# Altium footprint library ST Microelectronics STM32 G4.PcbLib: 21 footprints (part 1 of 3)
Each footprint in its own frame and in the unit in brackets; x right, y up, seen from the top. Pads: shape width x height; smd on the part's side, far side on the other; paste and mask are expansions set on the pad; w line width, h text height; cw(c..) or ccw(c..) is an arc to the next point about the centre after c.
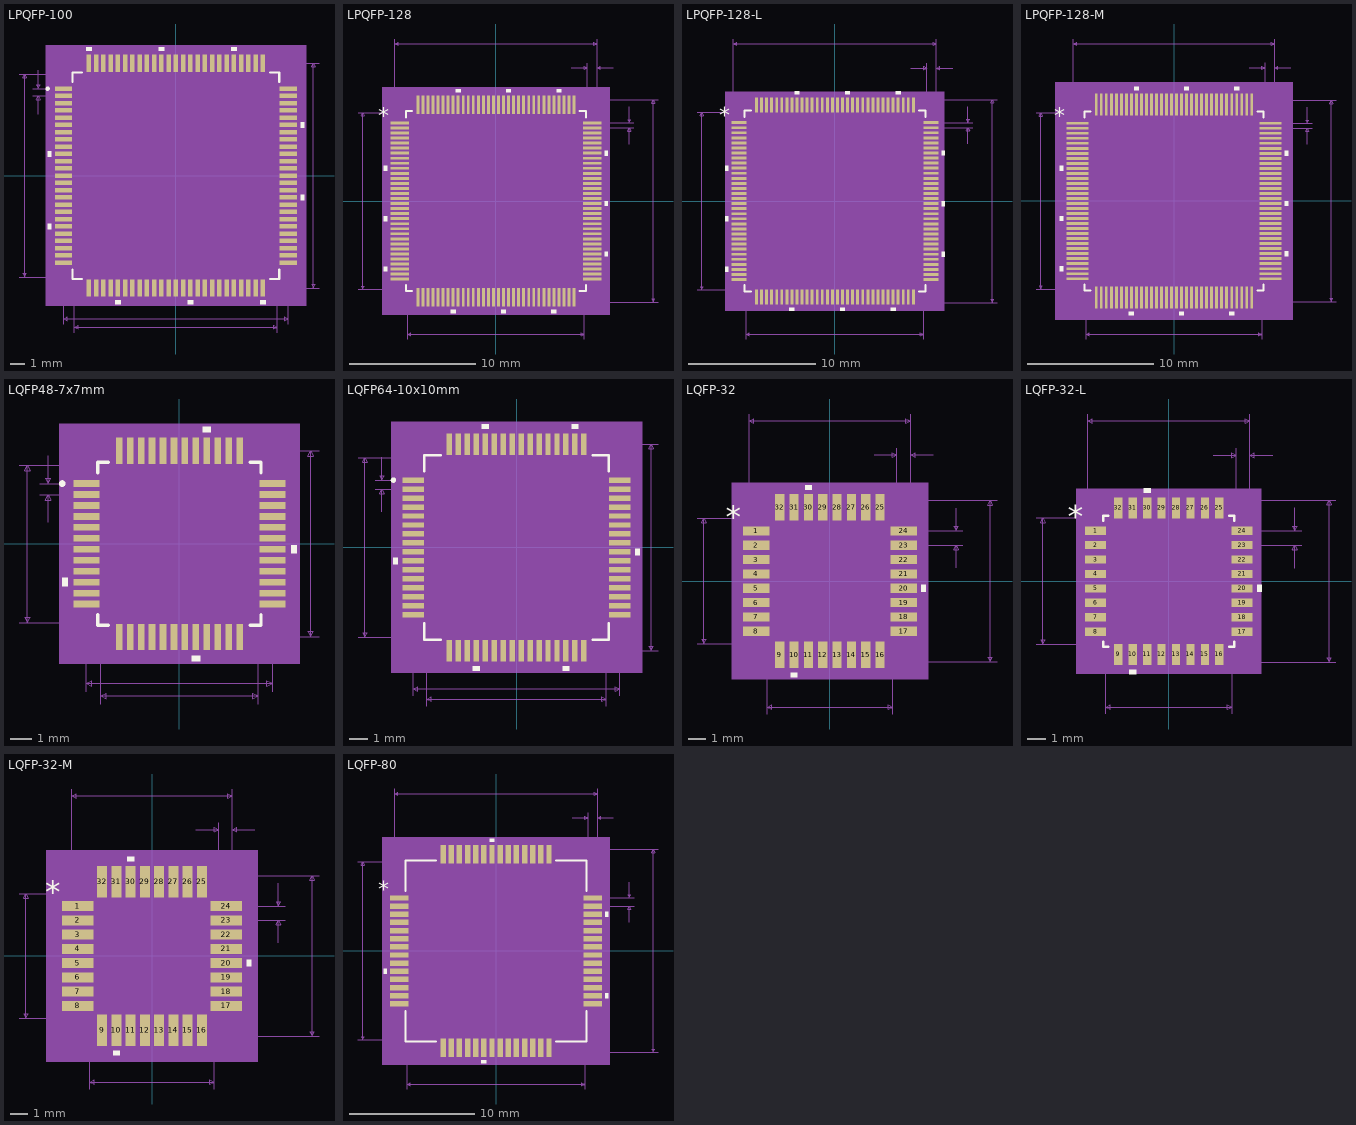
[diagram p0: the footprints below, top view; thin cyan lines are the x and y axes]

## LPQFP-100 [mil]
pads (100):
  rect 47x12 smd paste+0 mask+0: 1(-305.12,236.22) 2(-305.12,216.54) 3(-305.12,196.85) 4(-305.12,177.17) 5(-305.12,157.48) 6(-305.12,137.8) 7(-305.12,118.11) 8(-305.12,98.43) 9(-305.12,78.74) 10(-305.12,59.06) 11(-305.12,39.37) 12(-305.12,19.69) 13(-305.12,0) 14(-305.12,-19.68) 15(-305.12,-39.37) 16(-305.12,-59.06) 17(-305.12,-78.74) 18(-305.12,-98.43) 19(-305.12,-118.11) 20(-305.12,-137.8) 21(-305.12,-157.48) 22(-305.12,-177.17) 23(-305.12,-196.85) 24(-305.12,-216.54) 25(-305.12,-236.22) 51(305.12,-236.22) 52(305.12,-216.54) 53(305.12,-196.85) 54(305.12,-177.17) 55(305.12,-157.48) 56(305.12,-137.8) 57(305.12,-118.11) 58(305.12,-98.43) 59(305.12,-78.74) 60(305.12,-59.06) 61(305.12,-39.37) 62(305.12,-19.68) 63(305.12,0) 64(305.12,19.68) 65(305.12,39.37) 66(305.12,59.06) 67(305.12,78.74) 68(305.12,98.43) 69(305.12,118.11) 70(305.12,137.8) 71(305.12,157.48) 72(305.12,177.17) 73(305.12,196.85) 74(305.12,216.54) 75(305.12,236.22)
  rect 12x47 smd paste+0 mask+0: 26(-236.22,-305.12) 27(-216.54,-305.12) 28(-196.85,-305.12) 29(-177.17,-305.12) 30(-157.48,-305.12) 31(-137.8,-305.12) 32(-118.11,-305.12) 33(-98.43,-305.12) 34(-78.74,-305.12) 35(-59.06,-305.12) 36(-39.37,-305.12) 37(-19.68,-305.12) 38(0,-305.12) 39(19.68,-305.12) 40(39.37,-305.12) 41(59.06,-305.12) 42(78.74,-305.12) 43(98.43,-305.12) 44(118.11,-305.12) 45(137.8,-305.12) 46(157.48,-305.12) 47(177.17,-305.12) 48(196.85,-305.12) 49(216.54,-305.12) 50(236.22,-305.12) 76(236.22,305.12) 77(216.54,305.12) 78(196.85,305.12) 79(177.17,305.12) 80(157.48,305.12) 81(137.8,305.12) 82(118.11,305.12) 83(98.43,305.12) 84(78.74,305.12) 85(59.06,305.12) 86(39.37,305.12) 87(19.68,305.12) 88(0,305.12) 89(-19.68,305.12) 90(-39.37,305.12) 91(-59.06,305.12) 92(-78.74,305.12) 93(-98.43,305.12) 94(-118.11,305.12) 95(-137.8,305.12) 96(-157.48,305.12) 97(-177.17,305.12) 98(-196.85,305.12) 99(-216.54,305.12) 100(-236.22,305.12)
Top Overlay:
  circle w6: c-348.46,236.22 r3
  region: -228.72,338.62 -243.72,338.62 -243.72,348.62 -228.72,348.62
  region: -31.87,338.62 -46.87,338.62 -46.87,348.62 -31.87,348.62
  region: 164.98,338.62 149.98,338.62 149.98,348.62 164.98,348.62
  region: 338.62,145.3 348.62,145.3 348.62,130.3 338.62,130.3
  region: 338.62,-51.56 348.62,-51.56 348.62,-66.56 338.62,-66.56
  region: 243.72,-338.62 228.72,-338.62 228.72,-348.62 243.72,-348.62
  region: 46.87,-338.62 31.87,-338.62 31.87,-348.62 46.87,-348.62
  region: -149.98,-338.62 -164.98,-338.62 -164.98,-348.62 -149.98,-348.62
  region: -338.62,-130.3 -348.62,-130.3 -348.62,-145.3 -338.62,-145.3
  region: -338.62,66.56 -348.62,66.56 -348.62,51.56 -338.62,51.56
  lines w6: -280.5,-255.27 -280.5,-280.5 -255.27,-280.5 ; -280.5,255.27 -280.5,280.5 -255.27,280.5 ; 255.27,-280.5 280.5,-280.5 280.5,-255.27 ; 255.27,280.5 280.5,280.5 280.5,255.27
Mechanical 5:
  region: 353.62,-353.62 -353.62,-353.62 -353.62,353.62 353.62,353.62
Mechanical 7:
  lines w1: -426.12,-275.5 -236.22,-275.5 ; -426.12,275.5 -236.22,275.5 ; -388.62,216.54 -305.12,216.54 ; -388.62,236.22 -305.12,236.22 ; -373.62,166.54 -373.62,216.54 ; -373.62,286.22 -373.62,236.22 ; -305.12,-403.62 -305.12,-224.22 ; -275.5,-426.12 -275.5,-236.22 ; 248.22,-305.12 388.62,-305.12 ; 248.22,305.12 388.62,305.12 ; 275.5,-426.12 275.5,-236.22 ; 305.12,-403.62 305.12,-224.22 ; -411.12,-275.5 -406.12,-265.5 -416.12,-265.5 -411.12,-275.5 ; -411.12,-275.5 -411.12,275.5 ; -411.12,275.5 -406.12,265.5 -416.12,265.5 -411.12,275.5 ; -373.62,216.54 -368.62,206.54 -378.62,206.54 -373.62,216.54 ; -373.62,236.22 -368.62,246.22 -378.62,246.22 -373.62,236.22 ; -305.12,-388.62 -295.12,-393.62 -295.12,-383.62 -305.12,-388.62 ; -305.12,-388.62 305.12,-388.62 ; -275.5,-411.12 -265.5,-416.12 -265.5,-406.12 -275.5,-411.12 ; -275.5,-411.12 275.5,-411.12 ; 275.5,-411.12 265.5,-416.12 265.5,-406.12 275.5,-411.12 ; 305.12,-388.62 295.12,-393.62 295.12,-383.62 305.12,-388.62 ; 373.62,-305.12 378.62,-295.12 368.62,-295.12 373.62,-305.12 ; 373.62,-305.12 373.62,305.12 ; 373.62,305.12 378.62,295.12 368.62,295.12 373.62,305.12
  text "0.551in/13.995mm" at -631.12,-12.5 h25
  text "0.551in/13.995mm" at -100,-456.12 h25
  text "0.61in/15.5mm" at -81.25,-433.62 h25
  text "0.61in/15.5mm" at 393.62,-12.5 h25
  text "0.02in/0.5mm" at -543.62,213.88 h25
  text "Alt 2 Padstyle: OX90Y60D30P" at -337.5,-828.62 h50
  text "Alt 1 Padstyle: OX60Y90D30P" at -337.5,-768.62 h50
  text "Default Padstyle: RX47Y12D0T" at -350,-588.62 h50
Mechanical 13:
  circle w0: c-256.62,236.22 r3
  lines w1: -275.5,225.5 -225.5,275.5 ; -275.5,-275.5 -275.5,275.5 275.5,275.5 275.5,-275.5 -275.5,-275.5
Mechanical 15:
  region: -256.22,-285.5 -285.5,-285.5 -285.5,-256.22 -348.62,-256.22 -348.62,256.22 -285.5,256.22 -285.5,285.5 -256.22,285.5 -256.22,348.62 256.22,348.62 256.22,285.5 285.5,285.5 285.5,256.22 348.62,256.22 348.62,-256.22 285.5,-256.22 285.5,-285.5 256.22,-285.5 256.22,-348.62 -256.22,-348.62
  lines w6: -348.62,-256.22 -348.62,256.22 -285.5,256.22 -285.5,285.5 -256.22,285.5 -256.22,348.62 256.22,348.62 256.22,285.5 285.5,285.5 285.5,256.22 348.62,256.22 348.62,-256.22 285.5,-256.22 285.5,-285.5 256.22,-285.5 256.22,-348.62 -256.22,-348.62 -256.22,-285.5 -285.5,-285.5 -285.5,-256.22 -348.62,-256.22
3D body "LPQFP-100.step": height 63.11, standoff 0, extent -314.83,-314.84 314.85,314.85

## LPQFP-128 [mil]
pads (128):
  rect 58x9 smd paste+0 mask+0: 1(-300,243.35) 2(-300,227.65) 3(-300,211.95) 4(-300,196.25) 5(-300,180.55) 6(-300,164.85) 7(-300,149.15) 8(-300,133.45) 9(-300,117.75) 10(-300,102.05) 11(-300,86.35) 12(-300,70.65) 13(-300,54.95) 14(-300,39.25) 15(-300,23.55) 16(-300,7.85) 17(-300,-7.85) 18(-300,-23.55) 19(-300,-39.25) 20(-300,-54.95) 21(-300,-70.65) 22(-300,-86.35) 23(-300,-102.05) 24(-300,-117.75) 25(-300,-133.45) 26(-300,-149.15) 27(-300,-164.85) 28(-300,-180.55) 29(-300,-196.25) 30(-300,-211.95) 31(-300,-227.65) 32(-300,-243.35) 65(300,-243.35) 66(300,-227.65) 67(300,-211.95) 68(300,-196.25) 69(300,-180.55) 70(300,-164.85) 71(300,-149.15) 72(300,-133.45) 73(300,-117.75) 74(300,-102.05) 75(300,-86.35) 76(300,-70.65) 77(300,-54.95) 78(300,-39.25) 79(300,-23.55) 80(300,-7.85) 81(300,7.85) 82(300,23.55) 83(300,39.25) 84(300,54.95) 85(300,70.65) 86(300,86.35) 87(300,102.05) 88(300,117.75) 89(300,133.45) 90(300,149.15) 91(300,164.85) 92(300,180.55) 93(300,196.25) 94(300,211.95) 95(300,227.65) 96(300,243.35)
  rect 9x58 smd paste+0 mask+0: 33(-243.35,-300) 34(-227.65,-300) 35(-211.95,-300) 36(-196.25,-300) 37(-180.55,-300) 38(-164.85,-300) 39(-149.15,-300) 40(-133.45,-300) 41(-117.75,-300) 42(-102.05,-300) 43(-86.35,-300) 44(-70.65,-300) 45(-54.95,-300) 46(-39.25,-300) 47(-23.55,-300) 48(-7.85,-300) 49(7.85,-300) 50(23.55,-300) 51(39.25,-300) 52(54.95,-300) 53(70.65,-300) 54(86.35,-300) 55(102.05,-300) 56(117.75,-300) 57(133.45,-300) 58(149.15,-300) 59(164.85,-300) 60(180.55,-300) 61(196.25,-300) 62(211.95,-300) 63(227.65,-300) 64(243.35,-300) 97(243.35,300) 98(227.65,300) 99(211.95,300) 100(196.25,300) 101(180.55,300) 102(164.85,300) 103(149.15,300) 104(133.45,300) 105(117.75,300) 106(102.05,300) 107(86.35,300) 108(70.65,300) 109(54.95,300) 110(39.25,300) 111(23.55,300) 112(7.85,300) 113(-7.85,300) 114(-23.55,300) 115(-39.25,300) 116(-54.95,300) 117(-70.65,300) 118(-86.35,300) 119(-102.05,300) 120(-117.75,300) 121(-133.45,300) 122(-149.15,300) 123(-164.85,300) 124(-180.55,300) 125(-196.25,300) 126(-211.95,300) 127(-227.65,300) 128(-243.35,300)
Top Overlay:
  region: -339,109.55 -349,109.55 -349,94.55 -339,94.55
  region: -339,-47.45 -349,-47.45 -349,-62.45 -339,-62.45
  region: -339,-204.45 -349,-204.45 -349,-219.45 -339,-219.45
  region: -125.95,-339 -140.95,-339 -140.95,-349 -125.95,-349
  region: 31.05,-339 16.05,-339 16.05,-349 31.05,-349
  region: 188.05,-339 173.05,-339 173.05,-349 188.05,-349
  region: 339,-157.35 349,-157.35 349,-172.35 339,-172.35
  region: 339,-0.35 349,-0.35 349,-15.35 339,-15.35
  region: 339,156.65 349,156.65 349,141.65 339,141.65
  region: 203.75,339 188.75,339 188.75,349 203.75,349
  region: 46.75,339 31.75,339 31.75,349 46.75,349
  region: -110.25,339 -125.25,339 -125.25,349 -110.25,349
  lines w6: -280.5,-260.95 -280.5,-280.5 -260.95,-280.5 ; -280.5,260.95 -280.5,280.5 -260.95,280.5 ; 260.95,-280.5 280.5,-280.5 280.5,-260.95 ; 260.95,280.5 280.5,280.5 280.5,260.95
  text "*" at -366.5,241.2 h50
Mechanical 5:
  region: 354,-354 -354,-354 -354,354 354,354
Mechanical 7:
  lines w1: -430,-275.5 -243.35,-275.5 ; -430,275.5 -243.35,275.5 ; -315,243.35 -315,505 ; -275.5,-430 -275.5,-243.35 ; 235,415 285,415 ; 243.35,-315 505,-315 ; 243.35,315 505,315 ; 275.5,-430 275.5,-243.35 ; 285,243.35 285,430 ; 300,227.65 430,227.65 ; 300,243.35 430,243.35 ; 315,430 315,243.35 315,505 ; 365,415 315,415 ; 415,177.65 415,227.65 ; 415,293.35 415,243.35 ; -415,-275.5 -415,275.5 ; -415,-275.5 -420,-265.5 -410,-265.5 -415,-275.5 ; -415,275.5 -420,265.5 -410,265.5 -415,275.5 ; -315,490 315,490 ; -315,490 -305,495 -305,485 -315,490 ; -275.5,-415 275.5,-415 ; -275.5,-415 -265.5,-410 -265.5,-420 -275.5,-415 ; 275.5,-415 265.5,-410 265.5,-420 275.5,-415 ; 285,415 275,420 275,410 285,415 ; 315,415 325,420 325,410 315,415 ; 315,490 305,495 305,485 315,490 ; 415,227.65 410,217.65 420,217.65 415,227.65 ; 415,243.35 410,253.35 420,253.35 415,243.35 ; 490,-315 490,315 ; 490,-315 485,-305 495,-305 490,-315 ; 490,315 485,305 495,305 490,315
  text "Default Horiz Padstyle: RX9Y58D0T" at -412.5,-565 h50
  text "Default Vert Padstyle: RX9Y58D0T" at -400,-625 h50
  text "Alt 1 Padstyle: OX60Y90D30P" at -337.5,-805 h50
  text "Alt 2 Padstyle: OX90Y60D30P" at -337.5,-865 h50
  text "0.016in/0.399mm" at 435,223 h25
  text "0.03in/0.762mm" at 212.5,435 h25
  text "0.63in/16.002mm" at -93.75,510 h25
  text "0.551in/13.995mm" at -100,-460 h25
  text "0.551in/13.995mm" at -635,-12.5 h25
  text "0.63in/16.002mm" at 510,-12.5 h25
Mechanical 13:
  drawing of 517 lines, arcs and shapes, not listed
  text "*" at -273,226.2 h50
Mechanical 15:
  region: -257.85,-285.5 -285.5,-285.5 -285.5,-257.85 -339,-257.85 -339,257.85 -285.5,257.85 -285.5,285.5 -257.85,285.5 -257.85,339 257.85,339 257.85,285.5 285.5,285.5 285.5,257.85 339,257.85 339,-257.85 285.5,-257.85 285.5,-285.5 257.85,-285.5 257.85,-339 -257.85,-339
  lines w6: -339,-257.85 -285.5,-257.85 -285.5,-285.5 -257.85,-285.5 -257.85,-339 257.85,-339 257.85,-285.5 285.5,-285.5 285.5,-257.85 339,-257.85 339,257.85 285.5,257.85 285.5,285.5 257.85,285.5 257.85,339 -257.85,339 -257.85,285.5 -285.5,285.5 -285.5,257.85 -339,257.85 -339,-257.85
3D body "LPQFP-128.step": height 63.11, standoff 0, extent -314.99,-314.99 315,315.01

## LPQFP-128-L [mil]
pads (128):
  rect 46x9 smd paste+0 mask+0: 1(-298,243.35) 2(-298,227.65) 3(-298,211.95) 4(-298,196.25) 5(-298,180.55) 6(-298,164.85) 7(-298,149.15) 8(-298,133.45) 9(-298,117.75) 10(-298,102.05) 11(-298,86.35) 12(-298,70.65) 13(-298,54.95) 14(-298,39.25) 15(-298,23.55) 16(-298,7.85) 17(-298,-7.85) 18(-298,-23.55) 19(-298,-39.25) 20(-298,-54.95) 21(-298,-70.65) 22(-298,-86.35) 23(-298,-102.05) 24(-298,-117.75) 25(-298,-133.45) 26(-298,-149.15) 27(-298,-164.85) 28(-298,-180.55) 29(-298,-196.25) 30(-298,-211.95) 31(-298,-227.65) 32(-298,-243.35) 65(298,-243.35) 66(298,-227.65) 67(298,-211.95) 68(298,-196.25) 69(298,-180.55) 70(298,-164.85) 71(298,-149.15) 72(298,-133.45) 73(298,-117.75) 74(298,-102.05) 75(298,-86.35) 76(298,-70.65) 77(298,-54.95) 78(298,-39.25) 79(298,-23.55) 80(298,-7.85) 81(298,7.85) 82(298,23.55) 83(298,39.25) 84(298,54.95) 85(298,70.65) 86(298,86.35) 87(298,102.05) 88(298,117.75) 89(298,133.45) 90(298,149.15) 91(298,164.85) 92(298,180.55) 93(298,196.25) 94(298,211.95) 95(298,227.65) 96(298,243.35)
  rect 9x46 smd paste+0 mask+0: 33(-243.35,-298) 34(-227.65,-298) 35(-211.95,-298) 36(-196.25,-298) 37(-180.55,-298) 38(-164.85,-298) 39(-149.15,-298) 40(-133.45,-298) 41(-117.75,-298) 42(-102.05,-298) 43(-86.35,-298) 44(-70.65,-298) 45(-54.95,-298) 46(-39.25,-298) 47(-23.55,-298) 48(-7.85,-298) 49(7.85,-298) 50(23.55,-298) 51(39.25,-298) 52(54.95,-298) 53(70.65,-298) 54(86.35,-298) 55(102.05,-298) 56(117.75,-298) 57(133.45,-298) 58(149.15,-298) 59(164.85,-298) 60(180.55,-298) 61(196.25,-298) 62(211.95,-298) 63(227.65,-298) 64(243.35,-298) 97(243.35,298) 98(227.65,298) 99(211.95,298) 100(196.25,298) 101(180.55,298) 102(164.85,298) 103(149.15,298) 104(133.45,298) 105(117.75,298) 106(102.05,298) 107(86.35,298) 108(70.65,298) 109(54.95,298) 110(39.25,298) 111(23.55,298) 112(7.85,298) 113(-7.85,298) 114(-23.55,298) 115(-39.25,298) 116(-54.95,298) 117(-70.65,298) 118(-86.35,298) 119(-102.05,298) 120(-117.75,298) 121(-133.45,298) 122(-149.15,298) 123(-164.85,298) 124(-180.55,298) 125(-196.25,298) 126(-211.95,298) 127(-227.65,298) 128(-243.35,298)
Top Overlay:
  region: -110.25,331 -125.25,331 -125.25,341 -110.25,341
  region: 46.75,331 31.75,331 31.75,341 46.75,341
  region: 203.75,331 188.75,331 188.75,341 203.75,341
  region: 331,156.65 341,156.65 341,141.65 331,141.65
  region: 331,-0.35 341,-0.35 341,-15.35 331,-15.35
  region: 331,-157.35 341,-157.35 341,-172.35 331,-172.35
  region: 188.05,-331 173.05,-331 173.05,-341 188.05,-341
  region: 31.05,-331 16.05,-331 16.05,-341 31.05,-341
  region: -125.95,-331 -140.95,-331 -140.95,-341 -125.95,-341
  region: -331,-204.45 -341,-204.45 -341,-219.45 -331,-219.45
  region: -331,-47.45 -341,-47.45 -341,-62.45 -331,-62.45
  region: -331,109.55 -341,109.55 -341,94.55 -331,94.55
  lines w6: -280.5,-260.95 -280.5,-280.5 -260.95,-280.5 ; -280.5,260.95 -280.5,280.5 -260.95,280.5 ; 260.95,-280.5 280.5,-280.5 280.5,-260.95 ; 260.95,280.5 280.5,280.5 280.5,260.95
  text "*" at -358.5,241.2 h50
Mechanical 5:
  region: 340,-340 -340,-340 -340,340 340,340
Mechanical 7:
  lines w1: -428,-275.5 -243.35,-275.5 ; -428,275.5 -243.35,275.5 ; -315,243.35 -315,503 ; -275.5,-428 -275.5,-243.35 ; 235,413 285,413 ; 243.35,-315 503,-315 ; 243.35,315 503,315 ; 275.5,-428 275.5,-243.35 ; 285,243.35 285,428 ; 298,227.65 428,227.65 ; 298,243.35 428,243.35 ; 315,428 315,243.35 315,503 ; 365,413 315,413 ; 413,177.65 413,227.65 ; 413,293.35 413,243.35 ; -413,-275.5 -408,-265.5 -418,-265.5 -413,-275.5 ; -413,-275.5 -413,275.5 ; -413,275.5 -408,265.5 -418,265.5 -413,275.5 ; -315,488 -305,483 -305,493 -315,488 ; -315,488 315,488 ; -275.5,-413 -265.5,-418 -265.5,-408 -275.5,-413 ; -275.5,-413 275.5,-413 ; 275.5,-413 265.5,-418 265.5,-408 275.5,-413 ; 285,413 275,408 275,418 285,413 ; 315,413 325,408 325,418 315,413 ; 315,488 305,483 305,493 315,488 ; 413,227.65 418,217.65 408,217.65 413,227.65 ; 413,243.35 418,253.35 408,253.35 413,243.35 ; 488,-315 493,-305 483,-305 488,-315 ; 488,-315 488,315 ; 488,315 493,305 483,305 488,315
  text "0.63in/16.002mm" at 508,-12.5 h25
  text "0.551in/13.995mm" at -633,-12.5 h25
  text "0.551in/13.995mm" at -100,-458 h25
  text "0.63in/16.002mm" at -93.75,508 h25
  text "0.03in/0.762mm" at 212.5,433 h25
  text "0.016in/0.399mm" at 433,223 h25
  text "Alt 2 Padstyle: OX90Y60D30P" at -337.5,-863 h50
  text "Alt 1 Padstyle: OX60Y90D30P" at -337.5,-803 h50
  text "Default Vert Padstyle: RX9Y46D0T" at -400,-623 h50
  text "Default Horiz Padstyle: RX9Y46D0T" at -412.5,-563 h50
Mechanical 13:
  drawing of 517 lines, arcs and shapes, not listed
  text "*" at -273,226.2 h50
Mechanical 15:
  region: -251.85,-279.5 -279.5,-279.5 -279.5,-251.85 -325,-251.85 -325,251.85 -279.5,251.85 -279.5,279.5 -251.85,279.5 -251.85,325 251.85,325 251.85,279.5 279.5,279.5 279.5,251.85 325,251.85 325,-251.85 279.5,-251.85 279.5,-279.5 251.85,-279.5 251.85,-325 -251.85,-325
  lines w6: -325,-251.85 -325,251.85 -279.5,251.85 -279.5,279.5 -251.85,279.5 -251.85,325 251.85,325 251.85,279.5 279.5,279.5 279.5,251.85 325,251.85 325,-251.85 279.5,-251.85 279.5,-279.5 251.85,-279.5 251.85,-325 -251.85,-325 -251.85,-279.5 -279.5,-279.5 -279.5,-251.85 -325,-251.85
3D body "LPQFP-128-L.step": height 63.11, standoff 0, extent -314.99,-314.99 315,315

## LPQFP-128-M [mil]
pads (128):
  rect 70x9 smd paste+0 mask+0: 1(-302,243.35) 2(-302,227.65) 3(-302,211.95) 4(-302,196.25) 5(-302,180.55) 6(-302,164.85) 7(-302,149.15) 8(-302,133.45) 9(-302,117.75) 10(-302,102.05) 11(-302,86.35) 12(-302,70.65) 13(-302,54.95) 14(-302,39.25) 15(-302,23.55) 16(-302,7.85) 17(-302,-7.85) 18(-302,-23.55) 19(-302,-39.25) 20(-302,-54.95) 21(-302,-70.65) 22(-302,-86.35) 23(-302,-102.05) 24(-302,-117.75) 25(-302,-133.45) 26(-302,-149.15) 27(-302,-164.85) 28(-302,-180.55) 29(-302,-196.25) 30(-302,-211.95) 31(-302,-227.65) 32(-302,-243.35) 65(302,-243.35) 66(302,-227.65) 67(302,-211.95) 68(302,-196.25) 69(302,-180.55) 70(302,-164.85) 71(302,-149.15) 72(302,-133.45) 73(302,-117.75) 74(302,-102.05) 75(302,-86.35) 76(302,-70.65) 77(302,-54.95) 78(302,-39.25) 79(302,-23.55) 80(302,-7.85) 81(302,7.85) 82(302,23.55) 83(302,39.25) 84(302,54.95) 85(302,70.65) 86(302,86.35) 87(302,102.05) 88(302,117.75) 89(302,133.45) 90(302,149.15) 91(302,164.85) 92(302,180.55) 93(302,196.25) 94(302,211.95) 95(302,227.65) 96(302,243.35)
  rect 9x70 smd paste+0 mask+0: 33(-243.35,-302) 34(-227.65,-302) 35(-211.95,-302) 36(-196.25,-302) 37(-180.55,-302) 38(-164.85,-302) 39(-149.15,-302) 40(-133.45,-302) 41(-117.75,-302) 42(-102.05,-302) 43(-86.35,-302) 44(-70.65,-302) 45(-54.95,-302) 46(-39.25,-302) 47(-23.55,-302) 48(-7.85,-302) 49(7.85,-302) 50(23.55,-302) 51(39.25,-302) 52(54.95,-302) 53(70.65,-302) 54(86.35,-302) 55(102.05,-302) 56(117.75,-302) 57(133.45,-302) 58(149.15,-302) 59(164.85,-302) 60(180.55,-302) 61(196.25,-302) 62(211.95,-302) 63(227.65,-302) 64(243.35,-302) 97(243.35,302) 98(227.65,302) 99(211.95,302) 100(196.25,302) 101(180.55,302) 102(164.85,302) 103(149.15,302) 104(133.45,302) 105(117.75,302) 106(102.05,302) 107(86.35,302) 108(70.65,302) 109(54.95,302) 110(39.25,302) 111(23.55,302) 112(7.85,302) 113(-7.85,302) 114(-23.55,302) 115(-39.25,302) 116(-54.95,302) 117(-70.65,302) 118(-86.35,302) 119(-102.05,302) 120(-117.75,302) 121(-133.45,302) 122(-149.15,302) 123(-164.85,302) 124(-180.55,302) 125(-196.25,302) 126(-211.95,302) 127(-227.65,302) 128(-243.35,302)
Top Overlay:
  region: -347,109.55 -357,109.55 -357,94.55 -347,94.55
  region: -347,-47.45 -357,-47.45 -357,-62.45 -347,-62.45
  region: -347,-204.45 -357,-204.45 -357,-219.45 -347,-219.45
  region: -125.95,-347 -140.95,-347 -140.95,-357 -125.95,-357
  region: 31.05,-347 16.05,-347 16.05,-357 31.05,-357
  region: 188.05,-347 173.05,-347 173.05,-357 188.05,-357
  region: 347,-157.35 357,-157.35 357,-172.35 347,-172.35
  region: 347,-0.35 357,-0.35 357,-15.35 347,-15.35
  region: 347,156.65 357,156.65 357,141.65 347,141.65
  region: 203.75,347 188.75,347 188.75,357 203.75,357
  region: 46.75,347 31.75,347 31.75,357 46.75,357
  region: -110.25,347 -125.25,347 -125.25,357 -110.25,357
  lines w6: -280.5,-260.95 -280.5,-280.5 -260.95,-280.5 ; -280.5,260.95 -280.5,280.5 -260.95,280.5 ; 260.95,-280.5 280.5,-280.5 280.5,-260.95 ; 260.95,280.5 280.5,280.5 280.5,260.95
  text "*" at -374.5,241.2 h50
Mechanical 5:
  region: 372,-372 -372,-372 -372,372 372,372
Mechanical 7:
  lines w1: -432,-275.5 -243.35,-275.5 ; -432,275.5 -243.35,275.5 ; -315,243.35 -315,507 ; -275.5,-432 -275.5,-243.35 ; 235,417 285,417 ; 243.35,-315 507,-315 ; 243.35,315 507,315 ; 275.5,-432 275.5,-243.35 ; 285,243.35 285,432 ; 302,227.65 432,227.65 ; 302,243.35 432,243.35 ; 315,432 315,243.35 315,507 ; 365,417 315,417 ; 417,177.65 417,227.65 ; 417,293.35 417,243.35 ; -417,-275.5 -417,275.5 ; -417,-275.5 -422,-265.5 -412,-265.5 -417,-275.5 ; -417,275.5 -422,265.5 -412,265.5 -417,275.5 ; -315,492 315,492 ; -315,492 -305,497 -305,487 -315,492 ; -275.5,-417 275.5,-417 ; -275.5,-417 -265.5,-412 -265.5,-422 -275.5,-417 ; 275.5,-417 265.5,-412 265.5,-422 275.5,-417 ; 285,417 275,422 275,412 285,417 ; 315,417 325,422 325,412 315,417 ; 315,492 305,497 305,487 315,492 ; 417,227.65 412,217.65 422,217.65 417,227.65 ; 417,243.35 412,253.35 422,253.35 417,243.35 ; 492,-315 492,315 ; 492,-315 487,-305 497,-305 492,-315 ; 492,315 487,305 497,305 492,315
  text "Default Horiz Padstyle: RX9Y70D0T" at -412.5,-567 h50
  text "Default Vert Padstyle: RX9Y70D0T" at -400,-627 h50
  text "Alt 1 Padstyle: OX60Y90D30P" at -337.5,-807 h50
  text "Alt 2 Padstyle: OX90Y60D30P" at -337.5,-867 h50
  text "0.016in/0.399mm" at 437,223 h25
  text "0.03in/0.762mm" at 212.5,437 h25
  text "0.63in/16.002mm" at -93.75,512 h25
  text "0.551in/13.995mm" at -100,-462 h25
  text "0.551in/13.995mm" at -637,-12.5 h25
  text "0.63in/16.002mm" at 512,-12.5 h25
Mechanical 13:
  drawing of 517 lines, arcs and shapes, not listed
  text "*" at -273,226.2 h50
Mechanical 15:
  region: -267.85,-295.5 -295.5,-295.5 -295.5,-267.85 -357,-267.85 -357,267.85 -295.5,267.85 -295.5,295.5 -267.85,295.5 -267.85,357 267.85,357 267.85,295.5 295.5,295.5 295.5,267.85 357,267.85 357,-267.85 295.5,-267.85 295.5,-295.5 267.85,-295.5 267.85,-357 -267.85,-357
  lines w6: -357,-267.85 -295.5,-267.85 -295.5,-295.5 -267.85,-295.5 -267.85,-357 267.85,-357 267.85,-295.5 295.5,-295.5 295.5,-267.85 357,-267.85 357,267.85 295.5,267.85 295.5,295.5 267.85,295.5 267.85,357 -267.85,357 -267.85,295.5 -295.5,295.5 -295.5,267.85 -357,267.85 -357,-267.85
3D body "LPQFP-128-M.step": height 63.11, standoff 0, extent -314.99,-314.99 315,315.01
